# Altium footprint library Pezo_imp.PCBLIB: 98 footprints (part 3 of 7)
Each footprint in its own frame and in the unit in brackets; x right, y up, seen from the top. Pads: shape width x height; smd on the part's side, far side on the other; paste and mask are expansions set on the pad; w line width, h text height; cw(c..) or ccw(c..) is an arc to the next point about the centre after c.
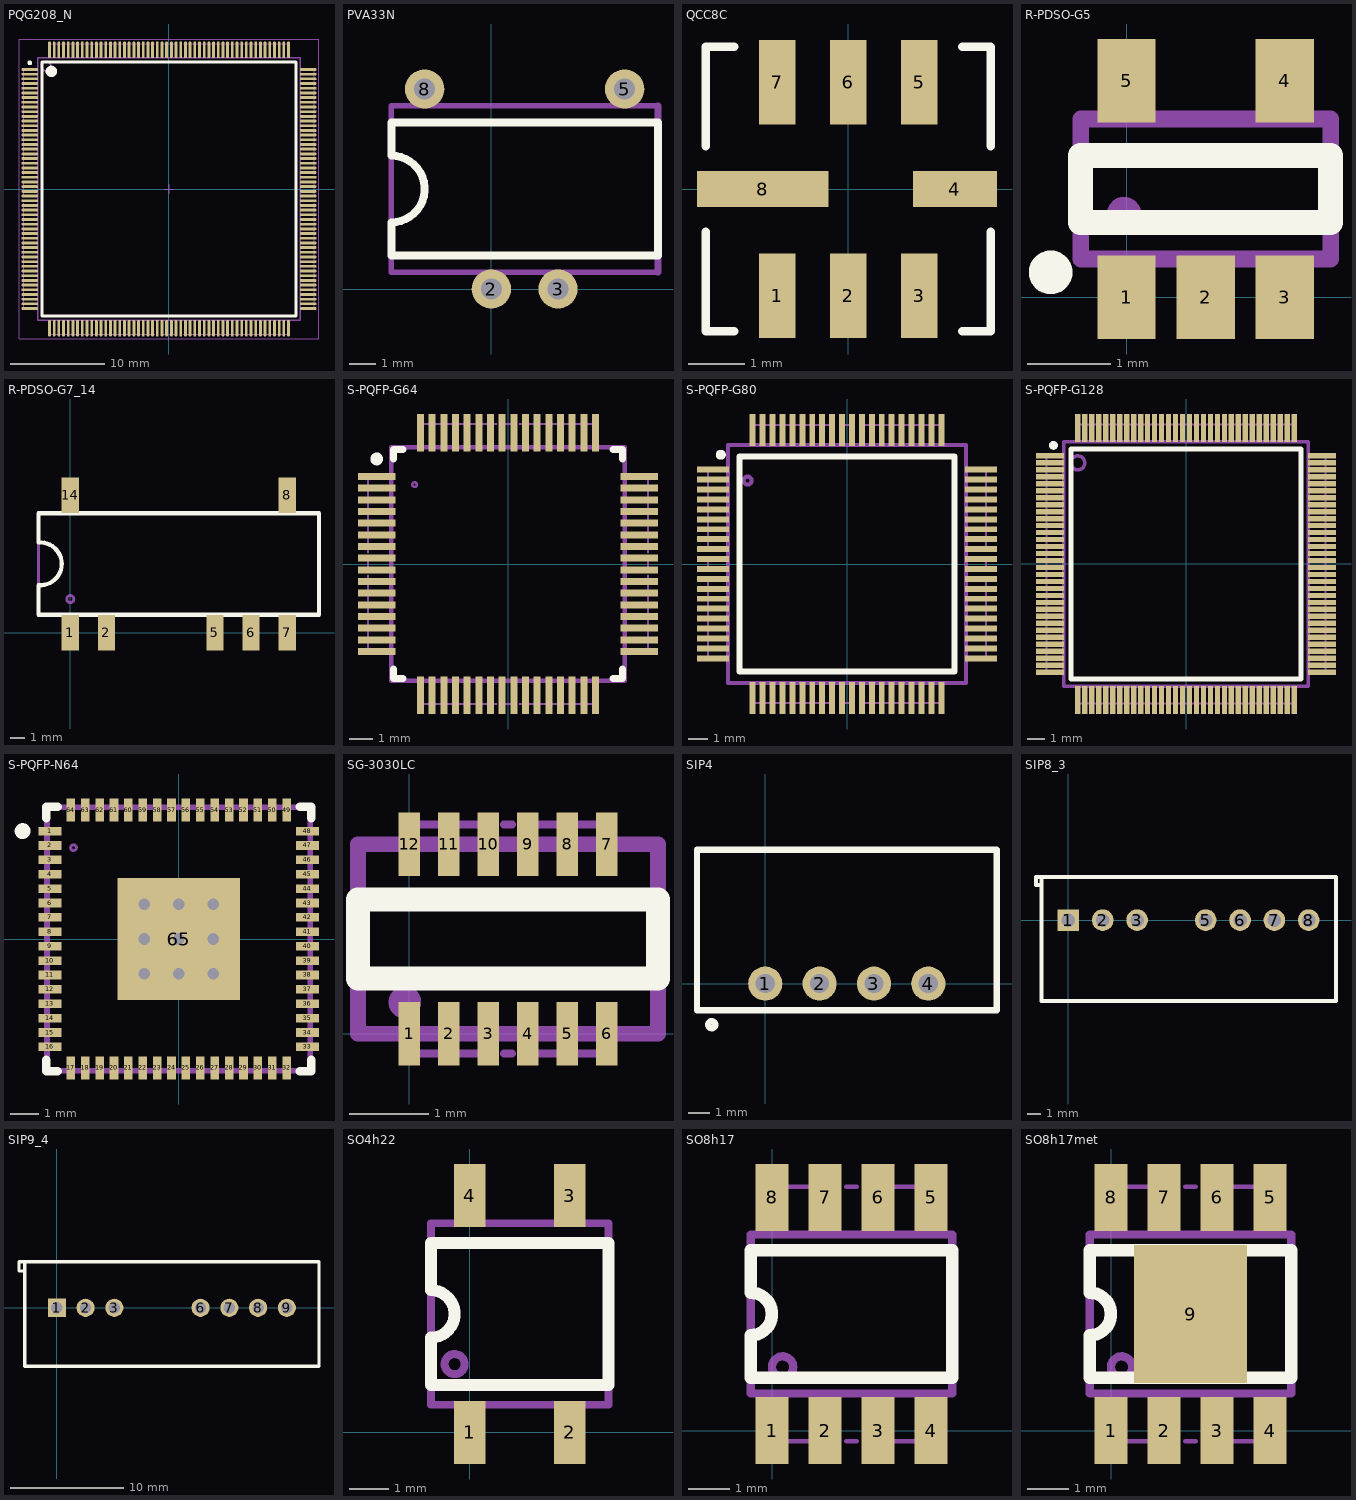
[diagram p2: the footprints below, top view; thin cyan lines are the x and y axes]

## PQG208_N [mm] "Shrink QFP, 208-Leads, Body 28x28mm, Pitch 0.5mm, IPC Medium Density"
height 4.1
pads (208):
  oval 1.8x0.3 smd: 1(-14.85,12.75) 2(-14.85,12.25) 3(-14.85,11.75) 4(-14.85,11.25) 5(-14.85,10.75) 6(-14.85,10.25) 7(-14.85,9.75) 8(-14.85,9.25) 9(-14.85,8.75) 10(-14.85,8.25) 11(-14.85,7.75) 12(-14.85,7.25) 13(-14.85,6.75) 14(-14.85,6.25) 15(-14.85,5.75) 16(-14.85,5.25) 17(-14.85,4.75) 18(-14.85,4.25) 19(-14.85,3.75) 20(-14.85,3.25) 21(-14.85,2.75) 22(-14.85,2.25) 23(-14.85,1.75) 24(-14.85,1.25) 25(-14.85,0.75) 26(-14.85,0.25) 27(-14.85,-0.25) 28(-14.85,-0.75) 29(-14.85,-1.25) 30(-14.85,-1.75) 31(-14.85,-2.25) 32(-14.85,-2.75) 33(-14.85,-3.25) 34(-14.85,-3.75) 35(-14.85,-4.25) 36(-14.85,-4.75) 37(-14.85,-5.25) 38(-14.85,-5.75) 39(-14.85,-6.25) 40(-14.85,-6.75) 41(-14.85,-7.25) 42(-14.85,-7.75) 43(-14.85,-8.25) 44(-14.85,-8.75) 45(-14.85,-9.25) 46(-14.85,-9.75) 47(-14.85,-10.25) 48(-14.85,-10.75) 49(-14.85,-11.25) 50(-14.85,-11.75) 51(-14.85,-12.25) 52(-14.85,-12.75) 105(14.85,-12.75) 106(14.85,-12.25) 107(14.85,-11.75) 108(14.85,-11.25) 109(14.85,-10.75) 110(14.85,-10.25) 111(14.85,-9.75) 112(14.85,-9.25) 113(14.85,-8.75) 114(14.85,-8.25) 115(14.85,-7.75) 116(14.85,-7.25) 117(14.85,-6.75) 118(14.85,-6.25) 119(14.85,-5.75) 120(14.85,-5.25) 121(14.85,-4.75) 122(14.85,-4.25) 123(14.85,-3.75) 124(14.85,-3.25) 125(14.85,-2.75) 126(14.85,-2.25) 127(14.85,-1.75) 128(14.85,-1.25) 129(14.85,-0.75) 130(14.85,-0.25) 131(14.85,0.25) 132(14.85,0.75) 133(14.85,1.25) 134(14.85,1.75) 135(14.85,2.25) 136(14.85,2.75) 137(14.85,3.25) 138(14.85,3.75) 139(14.85,4.25) 140(14.85,4.75) 141(14.85,5.25) 142(14.85,5.75) 143(14.85,6.25) 144(14.85,6.75) 145(14.85,7.25) 146(14.85,7.75) 147(14.85,8.25) 148(14.85,8.75) 149(14.85,9.25) 150(14.85,9.75) 151(14.85,10.25) 152(14.85,10.75) 153(14.85,11.25) 154(14.85,11.75) 155(14.85,12.25) 156(14.85,12.75)
  oval 0.3x1.8 smd: 53(-12.75,-14.85) 54(-12.25,-14.85) 55(-11.75,-14.85) 56(-11.25,-14.85) 57(-10.75,-14.85) 58(-10.25,-14.85) 59(-9.75,-14.85) 60(-9.25,-14.85) 61(-8.75,-14.85) 62(-8.25,-14.85) 63(-7.75,-14.85) 64(-7.25,-14.85) 65(-6.75,-14.85) 66(-6.25,-14.85) 67(-5.75,-14.85) 68(-5.25,-14.85) 69(-4.75,-14.85) 70(-4.25,-14.85) 71(-3.75,-14.85) 72(-3.25,-14.85) 73(-2.75,-14.85) 74(-2.25,-14.85) 75(-1.75,-14.85) 76(-1.25,-14.85) 77(-0.75,-14.85) 78(-0.25,-14.85) 79(0.25,-14.85) 80(0.75,-14.85) 81(1.25,-14.85) 82(1.75,-14.85) 83(2.25,-14.85) 84(2.75,-14.85) 85(3.25,-14.85) 86(3.75,-14.85) 87(4.25,-14.85) 88(4.75,-14.85) 89(5.25,-14.85) 90(5.75,-14.85) 91(6.25,-14.85) 92(6.75,-14.85) 93(7.25,-14.85) 94(7.75,-14.85) 95(8.25,-14.85) 96(8.75,-14.85) 97(9.25,-14.85) 98(9.75,-14.85) 99(10.25,-14.85) 100(10.75,-14.85) 101(11.25,-14.85) 102(11.75,-14.85) 103(12.25,-14.85) 104(12.75,-14.85) 157(12.75,14.85) 158(12.25,14.85) 159(11.75,14.85) 160(11.25,14.85) 161(10.75,14.85) 162(10.25,14.85) 163(9.75,14.85) 164(9.25,14.85) 165(8.75,14.85) 166(8.25,14.85) 167(7.75,14.85) 168(7.25,14.85) 169(6.75,14.85) 170(6.25,14.85) 171(5.75,14.85) 172(5.25,14.85) 173(4.75,14.85) 174(4.25,14.85) 175(3.75,14.85) 176(3.25,14.85) 177(2.75,14.85) 178(2.25,14.85) 179(1.75,14.85) 180(1.25,14.85) 181(0.75,14.85) 182(0.25,14.85) 183(-0.25,14.85) 184(-0.75,14.85) 185(-1.25,14.85) 186(-1.75,14.85) 187(-2.25,14.85) 188(-2.75,14.85) 189(-3.25,14.85) 190(-3.75,14.85) 191(-4.25,14.85) 192(-4.75,14.85) 193(-5.25,14.85) 194(-5.75,14.85) 195(-6.25,14.85) 196(-6.75,14.85) 197(-7.25,14.85) 198(-7.75,14.85) 199(-8.25,14.85) 200(-8.75,14.85) 201(-9.25,14.85) 202(-9.75,14.85) 203(-10.25,14.85) 204(-10.75,14.85) 205(-11.25,14.85) 206(-11.75,14.85) 207(-12.25,14.85) 208(-12.75,14.85)
Top Overlay:
  circle w0.25: c-14.85,13.45 r0.125
  circle w0.6: c-12.55,12.55 r0.3
  lines w0.3: -13.55,-13.55 13.55,-13.55 13.55,13.55 -13.55,13.55 -13.55,-13.55
Mechanical 1:
  circle w0.2: c-13.1,13.1 r0.5
  lines w0.1: -15.494,-12.827 -15.494,-1.5 ; -15.494,-0.762 -15.494,0.762 ; -15.494,1.5 -15.494,12.827 ; -12.827,-15.494 -1.5,-15.494 ; -12.827,15.494 -1.5,15.494 ; -0.762,-15.494 0.762,-15.494 ; -0.762,15.494 0.762,15.494 ; 1.5,-15.494 12.827,-15.494 ; 1.5,15.494 12.827,15.494 ; 15.494,-12.827 15.494,-1.5 ; 15.494,-0.762 15.494,0.762 ; 15.494,1.5 15.494,12.827
  lines w0.2: -15.494,-12.827 -14,-12.827 ; -15.494,12.827 -14,12.827 ; -12.827,-15.494 -12.827,-14 ; -12.827,14 -12.827,15.494 ; 12.827,-15.494 12.827,-14 ; 12.827,14 12.827,15.494 ; 14,-12.827 15.494,-12.827 ; 14,12.827 15.494,12.827 ; -14,-14 14,-14 14,14 -14,14 -14,-14
  text ".Designator" at -1.61,0.85 h1.5
  text ".Comment" at -2.9,-1.7 h1.5
Mechanical 15:
  lines w0.1: -0.5,0 0.5,0 ; 0,-0.5 0,0.5 ; -16,-16 16,-16 16,16 -16,16 -16,-16
3D body: height 4.1, standoff 0, extent -14,-14 14,14

## PVA33N [mm]
height 4.6
pads (4):
  round 1.5 hole 0.8: 2(0,0) 3(2.54,0) 5(5.08,7.62) 8(-2.54,7.62)
Top Overlay:
  lines w0.3: -3.81,1.27 6.35,1.27 6.35,6.35 -3.81,6.35 -3.81,5.08 cw(c-3.81,3.81) -3.81,2.54 -3.81,1.27
Mechanical 1:
  lines w0.025: -3.81,2.54 ccw(c-3.81,3.81) -3.81,5.08
  lines w0.2: -2.54,6.985 -2.54,7.62 ; 0,0 0,0.635 ; 2.54,0 2.54,0.635 ; 5.08,6.985 5.08,7.62 ; 6.35,0.635 -3.81,0.635 -3.81,6.985 6.35,6.985
  lines w0.25: 6.35,0.635 6.35,6.985
  text ".Designator" at 0.14,4.54 h1.5
  text ".Comment" at -1.45,2.84 h1.5
  text "8" at -2.73,5.64 h1.5
  text "8" at -2.73,5.64 h1.5
  text "5" at 4.89,5.64 h1.5
  text "3" at 2.35,1.195 h1.5
  text "2" at -0.317,1.195 h1.5
3D body "PVA33N.stp": height 4.6, standoff -3, extent -3.425,-0.125 5.975,7.745

## QCC8C [mm]
pads (8):
  rect 0.65x1.5 smd: 1(-1.27,-1.905) 2(0,-1.905) 3(1.27,-1.905) 5(1.27,1.905) 6(0,1.905) 7(-1.27,1.905)
  rect 1.5x0.65 smd: 4(1.905,0)
  rect 2.35x0.65 smd: 8(-1.524,0)
Top Overlay:
  lines w0.15: -2.54,-0.762 -2.54,-2.54 -2.032,-2.54 ; -2.54,0.762 -2.54,2.54 -2.032,2.54 ; 2.032,-2.54 2.54,-2.54 2.54,-0.762 ; 2.032,2.54 2.54,2.54 2.54,0.762
3D body "User Library-QCC8C.STEP": height 1.37, standoff -0.09, extent -2.495,-2.5 2.505,2.5

## R-PDSO-G5 [mm]
height 1.45
pads (5):
  rect 0.7x1 smd: 1(0,0) 2(0.95,0) 3(1.9,0) 4(1.9,2.6) 5(0,2.6)
Top Overlay:
  circle w0.3: c-0.912,0.3 r0.112
  lines w0.3: -0.55,0.9 -0.55,1.7 2.45,1.7 2.45,0.9 -0.55,0.9
Mechanical 1:
  circle w0.25: c-0.03,1 r0.08
  lines w0.2: 0,-0.2 0,0.45 ; 0,2.15 0,2.8 ; 1.9,-0.2 1.9,0.46 ; 1.9,2.15 1.9,2.8 ; -0.55,0.46 2.45,0.46 2.45,2.14 -0.55,2.14 -0.55,0.46 ; 0.95,-0.2 0.95,0.45 0.95,-0.2
  text ".Designator" at -0.02,3.16 h1.5
  text ".Comment" at -1.72,-1.44 h1.5
  text "5" at -1.1,2.35 h1.5
3D body "R-PDSO-G5.stp": height 1.46, standoff 0, extent -0.5,-0.2 2.4,2.8

## R-PDSO-G7_14 [mm]
height 5.33
pads (7):
  rect 1.2x2.5 smd: 1(0,0) 2(2.54,0) 5(10.16,0) 6(12.7,0) 7(15.24,0) 8(15.24,9.652) 14(0,9.652)
Top Overlay:
  lines w0.3: -2.23,3.342 -2.23,1.266 17.47,1.266 17.47,8.386 -2.23,8.386 -2.23,6.33 cw(c-2.1,4.836) -2.229,3.342
Mechanical 1:
  circle w0.2: c0,2.361 r0.251
  lines w0.2: 0,-0.424 0,1.266 ; 0,8.386 0,10.076 ; 2.54,-0.424 2.54,1.266 ; 10.16,-0.424 10.16,1.266 ; 12.7,-0.424 12.7,1.266 ; 15.24,-0.424 15.24,1.266 ; 15.24,8.386 15.24,10.076 ; -2.23,1.266 17.47,1.266 17.47,8.386 -2.23,8.386 -2.23,1.266
  text ".Designator" at 6.4,5.511 h1.5
  text ".Comment" at 4.5,3.411 h1.5
  text "14" at -0.49,6.956 h1.5
  text "8" at 15.02,6.871 h1.5
  text "7" at 14.79,1.881 h1.5
3D body "R-PDSO-G7_14.stp": height 5.33, standoff 0, extent -2.23,-0.424 17.47,10.076

## S-PQFP-G64 [mm] "QFN, 64-Leads, Body 9.1x9.1mm (max), Pitch 0.50mm, IPC Medium Density"
height 1.45
pads (64):
  rect 1.6x0.3 smd: 1(-5.625,3.75) 2(-5.625,3.25) 3(-5.625,2.75) 4(-5.625,2.25) 5(-5.625,1.75) 6(-5.625,1.25) 7(-5.625,0.75) 8(-5.625,0.25) 9(-5.625,-0.25) 10(-5.625,-0.75) 11(-5.625,-1.25) 12(-5.625,-1.75) 13(-5.625,-2.25) 14(-5.625,-2.75) 15(-5.625,-3.25) 16(-5.625,-3.75) 33(5.625,-3.75) 34(5.625,-3.25) 35(5.625,-2.75) 36(5.625,-2.25) 37(5.625,-1.75) 38(5.625,-1.25) 39(5.625,-0.75) 40(5.625,-0.25) 41(5.625,0.25) 42(5.625,0.75) 43(5.625,1.25) 44(5.625,1.75) 45(5.625,2.25) 46(5.625,2.75) 47(5.625,3.25) 48(5.625,3.75)
  rect 0.3x1.6 smd: 17(-3.75,-5.625) 18(-3.25,-5.625) 19(-2.75,-5.625) 20(-2.25,-5.625) 21(-1.75,-5.625) 22(-1.25,-5.625) 23(-0.75,-5.625) 24(-0.25,-5.625) 25(0.25,-5.625) 26(0.75,-5.625) 27(1.25,-5.625) 28(1.75,-5.625) 29(2.25,-5.625) 30(2.75,-5.625) 31(3.25,-5.625) 32(3.75,-5.625) 49(3.75,5.625) 50(3.25,5.625) 51(2.75,5.625) 52(2.25,5.625) 53(1.75,5.625) 54(1.25,5.625) 55(0.75,5.625) 56(0.25,5.625) 57(-0.25,5.625) 58(-0.75,5.625) 59(-1.25,5.625) 60(-1.75,5.625) 61(-2.25,5.625) 62(-2.75,5.625) 63(-3.25,5.625) 64(-3.75,5.625)
Top Overlay:
  circle w0.3: c-5.625,4.5 r0.125
  lines w0.3: -4.9,-4.5 -4.9,-4.9 -4.5,-4.9 ; -4.9,4.5 -4.9,4.9 -4.5,4.9 ; 4.5,-4.9 4.9,-4.9 4.9,-4.5 ; 4.5,4.9 4.9,4.9 4.9,4.5
Mechanical 1:
  circle w0.1: c-4,3.4 r0.1
  lines w0.1: -6,-3.75 -6,-0.5 ; -6,-0.125 -6,0.125 ; -6,0.5 -6,3.75 ; -3.75,-6 -0.5,-6 ; -3.75,6 -0.5,6 ; -0.125,-6 0.125,-6 ; -0.125,6 0.125,6 ; 0.5,-6 3.75,-6 ; 0.5,6 3.75,6 ; 6,-3.75 6,-0.5 ; 6,-0.125 6,0.125 ; 6,0.5 6,3.75
  lines w0.2: -6,-3.75 -5,-3.75 ; -6,3.75 -5,3.75 ; -3.75,-6 -3.75,-5 ; -3.75,5 -3.75,6 ; 3.75,-6 3.75,-5 ; 3.75,5 3.75,6 ; 5,-3.75 6,-3.75 ; 5,3.75 6,3.75 ; -5,-5 -5,5 5,5 5,-5 -5,-5
  text ".Designator" at -1.49,0.65 h1.5
  text ".Comment" at -3.08,-1.05 h1.5
  text "64" at -3.429,3.429 h1.5
3D body "S-PQFP-G64h1_45.stp": height 1.47, standoff 0, extent -6,-6 6,6

## S-PQFP-G80 [mm]
height 1.45
pads (80):
  rect 1.6x0.3 smd: 1(-6.75,4.75) 2(-6.75,4.25) 3(-6.75,3.75) 4(-6.75,3.25) 5(-6.75,2.75) 6(-6.75,2.25) 7(-6.75,1.75) 8(-6.75,1.25) 9(-6.75,0.75) 10(-6.75,0.25) 11(-6.75,-0.25) 12(-6.75,-0.75) 13(-6.75,-1.25) 14(-6.75,-1.75) 15(-6.75,-2.25) 16(-6.75,-2.75) 17(-6.75,-3.25) 18(-6.75,-3.75) 19(-6.75,-4.25) 20(-6.75,-4.75) 41(6.75,-4.75) 42(6.75,-4.25) 43(6.75,-3.75) 44(6.75,-3.25) 45(6.75,-2.75) 46(6.75,-2.25) 47(6.75,-1.75) 48(6.75,-1.25) 49(6.75,-0.75) 50(6.75,-0.25) 51(6.75,0.25) 52(6.75,0.75) 53(6.75,1.25) 54(6.75,1.75) 55(6.75,2.25) 56(6.75,2.75) 57(6.75,3.25) 58(6.75,3.75) 59(6.75,4.25) 60(6.75,4.75)
  rect 0.3x1.6 smd: 21(-4.75,-6.75) 22(-4.25,-6.75) 23(-3.75,-6.75) 24(-3.25,-6.75) 25(-2.75,-6.75) 26(-2.25,-6.75) 27(-1.75,-6.75) 28(-1.25,-6.75) 29(-0.75,-6.75) 30(-0.25,-6.75) 31(0.25,-6.75) 32(0.75,-6.75) 33(1.25,-6.75) 34(1.75,-6.75) 35(2.25,-6.75) 36(2.75,-6.75) 37(3.25,-6.75) 38(3.75,-6.75) 39(4.25,-6.75) 40(4.75,-6.75) 61(4.75,6.75) 62(4.25,6.75) 63(3.75,6.75) 64(3.25,6.75) 65(2.75,6.75) 66(2.25,6.75) 67(1.75,6.75) 68(1.25,6.75) 69(0.75,6.75) 70(0.25,6.75) 71(-0.25,6.75) 72(-0.75,6.75) 73(-1.25,6.75) 74(-1.75,6.75) 75(-2.25,6.75) 76(-2.75,6.75) 77(-3.25,6.75) 78(-3.75,6.75) 79(-4.25,6.75) 80(-4.75,6.75)
Top Overlay:
  circle w0.3: c-6.35,5.5 r0.1
  lines w0.3: -5.4,-5.4 5.4,-5.4 5.4,5.4 -5.4,5.4 -5.4,-5.4
Mechanical 1:
  lines w0.1: -7,-4.75 -7,-4.25 -7,-0.75 ; -7,-0.25 -7,0.25 ; -7,0.75 -7,4.75 ; -4.75,-7 -0.75,-7 ; -4.75,7 -4.25,7 -0.75,7 ; -0.25,-7 0.25,-7 ; -0.25,7 0.25,7 ; 0.75,-7 4.25,-7 4.75,-7 ; 0.75,7 4.75,7 ; 7,-4.75 7,-0.75 ; 7,-0.25 7,0.25 ; 7,0.75 7,4.25 7,4.75
  lines w0.2: -7,-4.75 -6,-4.75 ; -7,4.75 -6,4.75 ; -4.75,-7 -4.75,-6 ; -4.75,6 -4.75,7 ; 4.75,-7 4.75,-6 ; 4.75,6 4.75,7 ; 6,-4.75 7,-4.75 ; 6,4.75 7,4.75 ; -6,-6 6,-6 6,6 -6,6 -6,-6 ; -4.8,4.2 ccw(c-5,4.2) -4.8,4.2
  text ".Designator" at -1.28,0.23 h1.5
  text ".Comment" at -2.87,-1.47 h1.5
  text "80" at -4.6,4.4 h1.5
3D body "S-PQFP-G80h1_45.stp": height 1.47, standoff 0, extent -7,-7 7,7

## S-PQFP-G128 [mm]
height 1.45
pads (128):
  rect 1.6x0.3 smd: 1(-7.8,6.2) 2(-7.8,5.8) 3(-7.8,5.4) 4(-7.8,5) 5(-7.8,4.6) 6(-7.8,4.2) 7(-7.8,3.8) 8(-7.8,3.4) 9(-7.8,3) 10(-7.8,2.6) 11(-7.8,2.2) 12(-7.8,1.8) 13(-7.8,1.4) 14(-7.8,1) 15(-7.8,0.6) 16(-7.8,0.2) 17(-7.8,-0.2) 18(-7.8,-0.6) 19(-7.8,-1) 20(-7.8,-1.4) 21(-7.8,-1.8) 22(-7.8,-2.2) 23(-7.8,-2.6) 24(-7.8,-3) 25(-7.8,-3.4) 26(-7.8,-3.8) 27(-7.8,-4.2) 28(-7.8,-4.6) 29(-7.8,-5) 30(-7.8,-5.4) 31(-7.8,-5.8) 32(-7.8,-6.2) 65(7.8,-6.2) 66(7.8,-5.8) 67(7.8,-5.4) 68(7.8,-5) 69(7.8,-4.6) 70(7.8,-4.2) 71(7.8,-3.8) 72(7.8,-3.4) 73(7.8,-3) 74(7.8,-2.6) 75(7.8,-2.2) 76(7.8,-1.8) 77(7.8,-1.4) 78(7.8,-1) 79(7.8,-0.6) 80(7.8,-0.2) 81(7.8,0.2) 82(7.8,0.6) 83(7.8,1) 84(7.8,1.4) 85(7.8,1.8) 86(7.8,2.2) 87(7.8,2.6) 88(7.8,3) 89(7.8,3.4) 90(7.8,3.8) 91(7.8,4.2) 92(7.8,4.6) 93(7.8,5) 94(7.8,5.4) 95(7.8,5.8) 96(7.8,6.2)
  rect 0.3x1.6 smd: 33(-6.2,-7.8) 34(-5.8,-7.8) 35(-5.4,-7.8) 36(-5,-7.8) 37(-4.6,-7.8) 38(-4.2,-7.8) 39(-3.8,-7.8) 40(-3.4,-7.8) 41(-3,-7.8) 42(-2.6,-7.8) 43(-2.2,-7.8) 44(-1.8,-7.8) 45(-1.4,-7.8) 46(-1,-7.8) 47(-0.6,-7.8) 48(-0.2,-7.8) 49(0.2,-7.8) 50(0.6,-7.8) 51(1,-7.8) 52(1.4,-7.8) 53(1.8,-7.8) 54(2.2,-7.8) 55(2.6,-7.8) 56(3,-7.8) 57(3.4,-7.8) 58(3.8,-7.8) 59(4.2,-7.8) 60(4.6,-7.8) 61(5,-7.8) 62(5.4,-7.8) 63(5.8,-7.8) 64(6.2,-7.8) 97(6.2,7.8) 98(5.8,7.8) 99(5.4,7.8) 100(5,7.8) 101(4.6,7.8) 102(4.2,7.8) 103(3.8,7.8) 104(3.4,7.8) 105(3,7.8) 106(2.6,7.8) 107(2.2,7.8) 108(1.8,7.8) 109(1.4,7.8) 110(1,7.8) 111(0.6,7.8) 112(0.2,7.8) 113(-0.2,7.8) 114(-0.6,7.8) 115(-1,7.8) 116(-1.4,7.8) 117(-1.8,7.8) 118(-2.2,7.8) 119(-2.6,7.8) 120(-3,7.8) 121(-3.4,7.8) 122(-3.8,7.8) 123(-4.2,7.8) 124(-4.6,7.8) 125(-5,7.8) 126(-5.4,7.8) 127(-5.8,7.8) 128(-6.2,7.8)
Top Overlay:
  circle w0.3: c-7.6,6.8 r0.1
  lines w0.3: -6.6,-6.6 6.6,-6.6 6.6,6.6 -6.6,6.6 -6.6,-6.6
Mechanical 1:
  circle w0.2: c-6.2,5.8 r0.4
  lines w0.1: -7,-6.2 -8,-6.2 -8,6.2 -7,6.2 ; -6.2,-7 -6.2,-8 6.2,-8 6.2,-7 ; -6.2,7 -6.2,8 6.2,8 6.2,7 ; 7,-6.2 8,-6.2 8,6.2 7,6.2
  lines w0.2: -7,-7 7,-7 7,7 -7,7 -7,-7
  text ".Designator" at -1.11,0.28 h1.5
  text ".Comment" at -2.7,-1.42 h1.5
  text "128" at -5.1,5.2 h1.5
3D body "S-PQFP-G128h1_45.stp": height 1.47, standoff 0, extent -8,-8 8,8

## S-PQFP-N64 [mm] "QFN, 64-Leads, Body 9.1x9.1mm (max), Pitch 0.50mm, IPC Medium Density"
height 1
pads (65):
  rect 0.8x0.3 smd: 1(-4.475,3.75) 2(-4.475,3.25) 3(-4.475,2.75) 4(-4.475,2.25) 5(-4.475,1.75) 6(-4.475,1.25) 7(-4.475,0.75) 8(-4.475,0.25) 9(-4.475,-0.25) 10(-4.475,-0.75) 11(-4.475,-1.25) 12(-4.475,-1.75) 13(-4.475,-2.25) 14(-4.475,-2.75) 15(-4.475,-3.25) 16(-4.475,-3.75) 33(4.475,-3.75) 34(4.475,-3.25) 35(4.475,-2.75) 36(4.475,-2.25) 37(4.475,-1.75) 38(4.475,-1.25) 39(4.475,-0.75) 40(4.475,-0.25) 41(4.475,0.25) 42(4.475,0.75) 43(4.475,1.25) 44(4.475,1.75) 45(4.475,2.25) 46(4.475,2.75) 47(4.475,3.25) 48(4.475,3.75)
  rect 0.3x0.8 smd: 17(-3.75,-4.475) 18(-3.25,-4.475) 19(-2.75,-4.475) 20(-2.25,-4.475) 21(-1.75,-4.475) 22(-1.25,-4.475) 23(-0.75,-4.475) 24(-0.25,-4.475) 25(0.25,-4.475) 26(0.75,-4.475) 27(1.25,-4.475) 28(1.75,-4.475) 29(2.25,-4.475) 30(2.75,-4.475) 31(3.25,-4.475) 32(3.75,-4.475) 49(3.75,4.475) 50(3.25,4.475) 51(2.75,4.475) 52(2.25,4.475) 53(1.75,4.475) 54(1.25,4.475) 55(0.75,4.475) 56(0.25,4.475) 57(-0.25,4.475) 58(-0.75,4.475) 59(-1.25,4.475) 60(-1.75,4.475) 61(-2.25,4.475) 62(-2.75,4.475) 63(-3.25,4.475) 64(-3.75,4.475)
  rect 4.25x4.25 smd: 65(0,0)
via 1.2,-1.2 diameter 0.8 hole 0.4
via 0,-1.2 diameter 0.8 hole 0.4
via -1.2,-1.2 diameter 0.8 hole 0.4
via 1.2,0 diameter 0.8 hole 0.4
via 0,0 diameter 0.8 hole 0.4
via -1.2,0 diameter 0.8 hole 0.4
via 1.2,1.2 diameter 0.8 hole 0.4
via 0,1.2 diameter 0.8 hole 0.4
via -1.2,1.2 diameter 0.8 hole 0.4
Top Overlay:
  circle w0.3: c-5.425,3.75 r0.125
  lines w0.3: -4.6,-4.2 -4.6,-4.6 -4.2,-4.6 ; -4.6,4.2 -4.6,4.6 -4.2,4.6 ; 4.2,-4.6 4.6,-4.6 4.6,-4.2 ; 4.2,4.6 4.6,4.6 4.6,4.2
Mechanical 1:
  circle w0.1: c-3.656,3.175 r0.1
  lines w0.2: -4.575,-4.575 4.575,-4.575 4.575,4.575 -4.575,4.575 -4.575,-4.575
  text "64" at -3.429,3.429 h1.5
  text ".Comment" at -2.88,-1.15 h1.5
  text ".Designator" at -1.29,0.55 h1.5
3D body "S-PQFP-N64.stp": height 1, standoff 0, extent -4.575,-4.575 4.575,4.575

## SG-3030LC [mm]
pads (12):
  rect 0.27x0.8 smd: 1(0,0) 2(0.5,0) 3(1,0) 4(1.5,0) 5(2,0) 6(2.5,0) 7(2.5,2.4) 8(2,2.4) 9(1.5,2.4) 10(1,2.4) 11(0.5,2.4) 12(0,2.4)
Top Overlay:
  lines w0.3: -0.65,0.7 -0.65,1.7 3.15,1.7 3.15,0.7 -0.65,0.7
Mechanical 1:
  circle w0.2: c-0.057,0.4 r0.107
  lines w0.1: 0,-0.25 0.85,-0.25 ; 0,2.65 0.85,2.65 ; 1.2,-0.25 1.3,-0.25 ; 1.2,2.65 1.3,2.65 ; 1.65,-0.25 2.5,-0.25 ; 1.65,2.65 2.5,2.65
  lines w0.2: 0,-0.25 0,0 -0.65,0 ; 0,2.4 0,2.65 ; 2.5,-0.25 2.5,0 ; 2.5,2.4 2.5,2.65 ; -0.65,0 -0.65,2.4 3.15,2.4 3.15,0 -0.65,0
  text ".Designator" at 0.69,0.35 h1.5
  text ".Comment" at -1.61,-1.43 h1.5
  text "12" at -0.35,1.2 h1.5
3D body "SG-3030LC.stp": height 1.21, standoff 0, extent -0.65,-0.3 3.15,2.7

## SIP4 [mm]
height 10
pads (4):
  round 1.6 hole 0.9: 1(0,0) 2(2.54,0) 3(5.08,0) 4(7.62,0)
Top Overlay:
  lines w0.3: -2.345,-1.959 cw(c-2.5,-1.92) -2.34,-1.92 ; -3.19,-1.25 10.82,-1.25 10.82,6.25 -3.19,6.25 -3.19,-1.25
Mechanical 1:
  lines w0.2: -3.19,-1.25 -3.19,6.25 10.81,6.25 10.81,-1.25 -3.19,-1.25 ; -3.17,-1.25 -3.17,6.25 10.83,6.25 10.83,-1.25 -3.17,-1.25
  lines w0.25: 0.203,0.078 ccw(c0.011,-0.006) 0.21,0.06
  text ".Designator" at 1.89,4.08 h1.5
  text ".Comment" at 0.3,2.38 h1.5
3D body "SIP4.stp": height 10, standoff -3, extent -3.175,-1.25 10.825,6.25

## SIP8_3 [mm]
height 11.1
pads (7):
  rect 1.6x1.6 hole 1: 1(0,0)
  round 1.6 hole 1: 2(2.54,0) 3(5.08,0) 5(10.16,0) 6(12.7,0) 7(15.24,0) 8(17.78,0)
Top Overlay:
  lines w0.3: -2,2.6 -2.4,2.6 -2.4,3.2 -2,3.2 ; -2,3.2 19.8,3.2 19.8,-6 -2,-6 -2,3.2
Mechanical 1:
  lines w0.2: -2,-6 19.8,-6 19.8,3.2 -2,3.2 -2,-6
  lines w0.25: 0.203,0.078 ccw(c0.011,-0.006) 0.21,0.06
  text ".Designator" at 8.04,-2.4 h1.5
  text ".Comment" at 6.45,-4.1 h1.5
  text "8" at 17.8,-0.4 h1.5
  text "1" at -0.2,-0.4 h1.5
3D body "SIP8.stp": height 11.1, standoff -3, extent -2,-6 19.8,3.2

## SIP9_4 [mm]
height 12.45
pads (7):
  rect 1.6x1.6 hole 1: 1(0,0)
  round 1.6 hole 1: 2(2.54,0) 3(5.08,0) 6(12.7,0) 7(15.24,0) 8(17.78,0) 9(20.32,0)
Top Overlay:
  lines w0.3: -2.84,3.25 -3.34,3.25 -3.34,4.05 -2.84,4.05 ; -2.84,4.05 23.16,4.05 23.16,-5.15 -2.84,-5.15 -2.84,4.05
Mechanical 1:
  lines w0.2: -2.84,-5.15 23.16,-5.15 23.16,4.05 -2.84,4.05 -2.84,-5.15
  lines w0.25: 0.203,0.078 ccw(c0.011,-0.006) 0.21,0.06
  text ".Designator" at 9.23,-2.04 h1.5
  text ".Comment" at 7.64,-3.74 h1.5
  text "8" at 20.34,-0.4 h1.5
  text "1" at -0.2,-0.4 h1.5
3D body "SIP9_4.stp": height 12.45, standoff -3, extent -2.84,-5.15 23.16,4.05

## SO4h22 [mm]
height 2.2
pads (4):
  rect 0.8x1.6 smd: 1(0,0) 2(2.54,0) 3(2.54,6) 4(0,6)
Top Overlay:
  lines w0.3: -0.98,2.402 ccw(c-0.98,3.001) -0.98,3.6 -0.98,4.8 3.52,4.8 3.52,1.2 -0.98,1.2 -0.98,2.405
Mechanical 1:
  circle w0.2: c-0.381,1.73 r0.254
  lines w0.2: 0,-0.375 0,0.7 ; 0,5.3 0,6.375 ; 2.54,-0.375 2.54,0.7 ; 2.54,5.3 2.54,6.375 ; -0.98,0.7 3.52,0.7 3.52,5.3 -0.98,5.3 -0.98,0.7
  text "4" at -0.485,3.656 h1.5
  text ".Comment" at -1.51,-1.79 h1.5
  text ".Designator" at 0.34,2.26 h1.5
3D body "SO4h22.stp": height 2.21, standoff 0, extent -0.975,-0.4 3.525,6.4

## SO8h17 [mm]
height 1.7
pads (8):
  rect 0.8x1.6 smd: 1(0,0) 2(1.27,0) 3(2.54,0) 4(3.81,0) 5(3.81,5.588) 6(2.54,5.588) 7(1.27,5.588) 8(0,5.588)
Top Overlay:
  lines w0.3: -0.508,1.27 4.318,1.27 4.318,4.318 -0.508,4.318 -0.508,3.302 cw(c-0.508,2.794) -0.508,2.286 -0.508,1.27
Mechanical 1:
  circle w0.2: c0.254,1.524 r0.254
  lines w0.1: 0,-0.254 1.27,-0.254 ; 0,5.842 1.27,5.842 ; 1.778,-0.254 2.032,-0.254 ; 1.778,5.842 2.032,5.842 ; 2.54,-0.254 3.81,-0.254 ; 2.54,5.842 3.81,5.842
  lines w0.2: 0,-0.254 0,0.762 ; 0,4.826 0,5.842 ; 3.81,-0.254 3.81,0.762 ; 3.81,4.826 3.81,5.842 ; -0.508,0.889 4.318,0.889 4.318,4.699 -0.508,4.699 -0.508,0.889
  text ".Designator" at 0.84,2.23 h1.5
  text ".Comment" at -0.98,-1.79 h1.5
  text "8" at 0.15,3.45 h1.5
3D body "SO8h17.stp": height 1.71, standoff 0, extent -0.6,-0.35 4.4,5.95

## SO8h17met [mm]
height 1.7
pads (9):
  rect 0.8x1.6 smd: 1(0,0) 2(1.27,0) 3(2.54,0) 4(3.81,0) 5(3.81,5.588) 6(2.54,5.588) 7(1.27,5.588) 8(0,5.588)
  rect 2.7x3.3 smd: 9(1.905,2.794)
Top Overlay:
  lines w0.3: -0.508,1.27 -0.508,2.286 ccw(c-0.508,2.794) -0.508,3.302 -0.508,4.318 4.318,4.318 4.318,1.27 -0.508,1.27
Mechanical 1:
  circle w0.2: c0.254,1.524 r0.254
  lines w0.1: 0,-0.254 1.27,-0.254 ; 0,5.842 1.27,5.842 ; 1.778,-0.254 2.032,-0.254 ; 1.778,5.842 2.032,5.842 ; 2.54,-0.254 3.81,-0.254 ; 2.54,5.842 3.81,5.842
  lines w0.2: 0,-0.254 0,0.762 ; 0,4.826 0,5.842 ; 3.81,-0.254 3.81,0.762 ; 3.81,4.826 3.81,5.842 ; -0.508,0.889 -0.508,4.699 4.318,4.699 4.318,0.889 -0.508,0.889
  text "8" at 0.15,3.45 h1.5
  text ".Comment" at -1.08,-1.6 h1.5
  text ".Designator" at 0.78,2.04 h1.5
3D body "SO8h17.stp": height 1.71, standoff 0, extent -0.6,-0.35 4.4,5.95